# Altium footprint library Miscellaneous Socket.PcbLib: 51 footprints (part 3 of 4)
Each footprint in its own frame and in the unit in brackets; x right, y up, seen from the top. Pads: shape width x height; smd on the part's side, far side on the other; paste and mask are expansions set on the pad; w line width, h text height; cw(c..) or ccw(c..) is an arc to the next point about the centre after c.
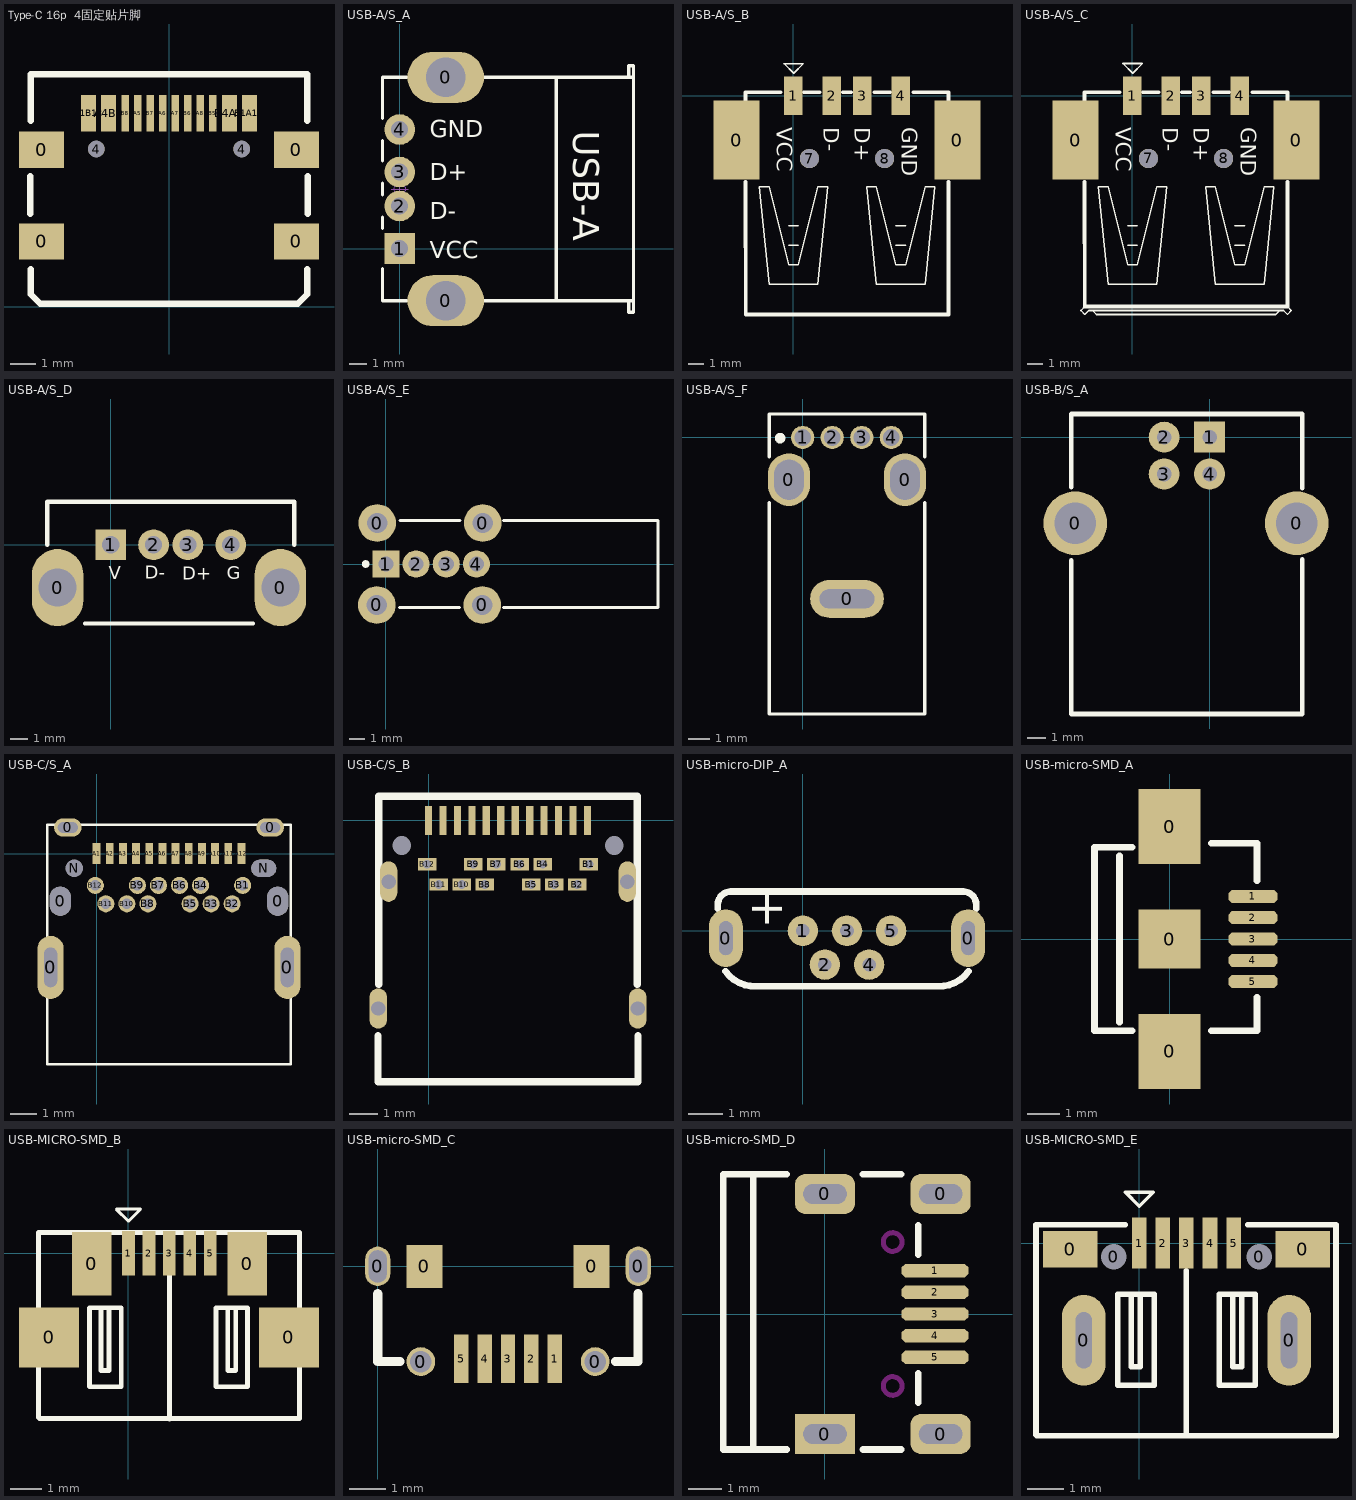
[diagram p2: the footprints below, top view; thin cyan lines are the x and y axes]

## Type-C 16p  4固定贴片脚 [mm] "USB Type-C 插座 4固定插脚"
pads (18):
  rect 1.8x1.45 smd: 0(-5.07,2.6) 0(-5.07,6.25) 0(5.07,2.6) 0(5.07,6.25)
  round 0.66 hole 0.66: 4(-2.89,6.28) 4(2.89,6.28)
  rect 0.6x1.45 smd: A1B12(-3.2,7.695) A4B9(-2.4,7.695) B1A12(3.2,7.695) B4A9(2.4,7.695)
  rect 0.3x1.45 smd: A5(-1.25,7.695) A6(-0.25,7.695) A7(0.25,7.695) A8(1.25,7.695) B5(1.75,7.695) B6(0.75,7.695) B7(-0.75,7.695) B8(-1.75,7.695)
Top Overlay:
  lines w0.254: -5.52,3.7 -5.52,5.2 ; -5.5,1.5 -5.5,0.5 -5.127,0.127 -5,0.127 5,0.127 5.127,0.127 5.5,0.5 5.5,1.5 ; -5.5,7.41 -5.5,9.25 5.5,9.25 5.5,7.41 ; 5.52,3.7 5.52,5.2

## USB-A/S_A [mm]
height 7.01
pads (6):
  oval 4.5x3 hole 2.3: 0(2.71,-3.07) 0(2.71,10.07)
  rect 1.8x1.8 hole 1: 1(0,0)
  round 1.8 hole 1: 2(0,2.5) 3(0,4.5) 4(0,7)
Top Overlay:
  lines w0.2: -1.01,-1.2 -1.01,-3.065 0.41,-3.065 ; -1.01,1.2 -1.01,1.84 ; -1.01,3.16 -1.01,3.84 ; -1.01,5.16 -1.01,6.34 ; -1.01,7.66 -1.01,10.065 0.41,10.065 ; 5.01,-3.065 13.752,-3.065 ; 5.01,10.065 13.752,10.065 ; 13.462,-3.065 13.462,-3.75 13.752,-3.75 13.752,10.75 13.462,10.75 13.462,10.065
  lines w0.203: 9.21,-3.065 9.21,10.065
  text "GND" at 1.778,6.548 h1.02
  text "D+" at 1.778,4.008 h1.02
  text "D-" at 1.778,1.722 h1.02
  text "VCC" at 1.778,-0.564 h1.02
  text "USB-A" at 10.21,6.93 h1.52
Mechanical 15:
  circle w0.05: c0,3.5 r0.35
  lines w0.05: -0.5,3.5 0.5,3.5 ; 0,3 0,4
3D body "USB-A_SA.STEP": height 6.8, standoff -4.31, extent -0.548,-3.81 13.756,10.874

## USB-A/S_B [mm]
pads (8):
  rect 3x5.15 smd: 0(-3.7,-2.9) 0(10.7,-2.9)
  rect 1.2x2.5 smd: 1(0,0) 2(2.5,0) 3(4.5,0) 4(7,0)
  round 1.25 hole 1.25 unplated: 7(1.05,-4.1) 8(5.95,-4.1)
Top Overlay:
  lines w0.1: -0.303,-9.749 0.332,-9.749 ; -0.303,-8.479 0.332,-8.479 ; 6.682,-9.749 7.317,-9.749 ; 6.682,-8.479 7.317,-8.479 ; -2.208,-5.939 -1.573,-12.289 1.602,-12.289 2.237,-5.939 1.602,-5.939 0.332,-11.019 -0.303,-11.019 -1.573,-5.939 -2.208,-5.939 ; -0.613,2.09 0.022,1.455 0.657,2.09 -0.613,2.09 ; 4.777,-5.939 5.412,-12.289 8.587,-12.289 9.222,-5.939 8.587,-5.939 7.317,-11.019 6.682,-11.019 5.412,-5.939 4.777,-5.939
  lines w0.254: -3.104,-5.624 -3.097,-14.26 10.111,-14.26 10.104,-5.624 ; -3.104,-0.29 -3.104,0.218 -0.818,0.218 ; 0.706,0.218 1.722,0.218 ; 3.246,0.218 3.754,0.218 ; 5.278,0.218 6.294,0.218 ; 7.818,0.218 10.111,0.218 10.104,-0.29
  text "GND" at 7.056,-2.068 h1.02
  text "D+" at 4.008,-2.068 h1.02
  text "D-" at 1.976,-2.068 h1.02
  text "VCC" at -1.072,-2.068 h1.02
3D body "USB-A_S-B.STEP": height 6.9, standoff -0.55, extent -4.321,-13.97 11.179,0.73

## USB-A/S_C [mm]
pads (8):
  rect 3x5.15 smd: 0(-3.7,-2.9) 0(10.7,-2.9)
  rect 1.2x2.5 smd: 1(0,0) 2(2.5,0) 3(4.5,0) 4(7,0)
  round 1.25 hole 1.25 unplated: 7(1.05,-4.1) 8(5.95,-4.1)
Top Overlay:
  lines w0.1: -3.097,-13.752 -3.351,-14.006 -3.097,-14.26 -2.843,-14.006 -2.589,-14.006 ; -0.303,-9.749 0.332,-9.749 ; -0.303,-8.479 0.332,-8.479 ; 6.682,-9.749 7.317,-9.749 ; 6.682,-8.479 7.317,-8.479 ; 10.111,-13.752 10.365,-14.006 10.111,-14.26 9.857,-14.006 9.603,-14.006 ; -2.589,-14.006 -2.335,-14.266 9.349,-14.266 9.603,-14.006 ; -2.589,-14.006 9.603,-14.006 ; -2.208,-5.939 -1.573,-12.289 1.602,-12.289 2.237,-5.939 1.602,-5.939 0.332,-11.019 -0.303,-11.019 -1.573,-5.939 -2.208,-5.939 ; -0.613,2.09 0.022,1.455 0.657,2.09 -0.613,2.09 ; 4.777,-5.939 5.412,-12.289 8.587,-12.289 9.222,-5.939 8.587,-5.939 7.317,-11.019 6.682,-11.019 5.412,-5.939 4.777,-5.939
  lines w0.254: -3.104,-5.624 -3.097,-13.752 10.111,-13.752 10.104,-5.624 ; -3.104,-0.29 -3.104,0.218 -0.818,0.218 ; 0.706,0.218 1.722,0.218 ; 3.246,0.218 3.754,0.218 ; 5.278,0.218 6.294,0.218 ; 7.818,0.218 10.111,0.218 10.104,-0.29
  text "GND" at 7.056,-2.068 h1.02
  text "D+" at 4.008,-2.068 h1.02
  text "D-" at 1.976,-2.068 h1.02
  text "VCC" at -1.072,-2.068 h1.02
3D body "USB-A_S-C.STEP": height 7.4, standoff -0.55, extent -4.321,-14.192 11.179,0.508

## USB-A/S_D [mm]
pads (6):
  oval 3x4.5 hole 2.2: 0(-3.1,-2.5) 0(9.9,-2.5)
  rect 1.8x1.8 hole 1: 1(0,0)
  round 1.8 hole 1: 2(2.5,0) 3(4.5,0) 4(7,0)
Top Overlay:
  lines w0.254: -3.7,0 -3.7,2.5 10.7,2.5 10.7,0 ; -1.5,-4.6 8.3,-4.6
  text "D-" at 1.996,-1.981 h0.76
  text "D+" at 4.181,-2.032 h0.76
  text "G" at 6.771,-2.007 h0.76
  text "V" at -0.112,-2.007 h0.76
Mechanical 1:
  lines w0.254: -0.2,-0.2 cw(c0,-0.2) 0,0
3D body "USB-A_S-D.STEP": height 14, standoff -4, extent -3.644,-4.587 10.756,2.413

## USB-A/S_E [mm]
pads (8):
  round 2.5 hole 1.35: 0(-0.607,-2.718) 0(-0.581,2.718) 0(6.393,-2.718) 0(6.419,2.718)
  rect 1.8x1.8 hole 1: 1(0,0)
  round 1.8 hole 1: 2(2,0) 3(4,0) 4(6,0)
Top Overlay:
  circle w0.25: c-1.35,0 r0.125
  lines w0.2: 0.91,-2.878 4.876,-2.878 ; 0.936,2.878 4.902,2.878 ; 7.787,-2.88 18.052,-2.88 18.052,2.88 7.787,2.88

## USB-A/S_F [mm]
pads (7):
  oval 2x2.5 hole 1.4 slot 1.9 at 90 deg: 0(-0.65,-2) 0(4.85,-2)
  oval 3.5x1.8 hole 0.9 slot 2.6 at 0 deg: 0(2.1,-7.65)
  round 1.1 hole 0.8: 1(0,0) 2(1.4,0) 3(2.8,0) 4(4.2,0)
Top Overlay:
  circle w0.25: c-1.073,-0.03 r0.125
  lines w0.152: -1.583,-3.078 -1.583,-13.111 5.783,-13.111 5.783,-3.078 ; -1.583,-0.919 -1.583,1.113 5.783,1.113 5.783,-0.919
3D body "USB-A_S-F.STEP": height 13.7, standoff -3.05, extent -1.532,-13.096 5.588,0.904

## USB-B/S_A [mm]
height 1.1
pads (6):
  round 3.5 hole 2.3: 0(-7.391,-4.742) 0(4.801,-4.742)
  rect 1.7x1.7 hole 0.8: 1(0,0)
  round 1.7 hole 0.8: 2(-2.5,0) 3(-2.5,-2.032) 4(0,-2.032)
Top Overlay:
  lines w0.254: -7.6,-6.769 -7.6,-15.24 5.1,-15.24 5.1,-6.718 ; -7.6,-2.756 -7.6,1.27 5.1,1.27 5.1,-2.807
3D body "USB-B_S-A.STEP": height 11.45, standoff -2.95, extent -8.004,-15.262 5.715,1.038

## USB-C/S_A [mm]
pads (32):
  oval 1x2.4 hole 0.5 slot 1.5 at 90 deg: 0(-1.75,-4.325) 0(7.25,-4.325)
  oval 0.8x1.1 hole 0.8 slot 1.1 at 90 deg: 0(-1.38,-1.81) 0(6.88,-1.81)
  oval 1.05x0.7 hole 0.4 slot 0.75 at 0 deg: 0(-1.095,0.99) 0(6.595,0.99)
  rect 0.3x0.8 smd: A1(0,0) A2(0.5,0) A3(1,0) A4(1.5,0) A5(2,0) A6(2.5,0) A7(3,0) A8(3.5,0) A9(4,0) A10(4.5,0) A11(5,0) A12(5.5,0)
  round 0.65 hole 0.4: B1(5.55,-1.21) B2(5.15,-1.91) B3(4.35,-1.91) B4(3.95,-1.21) B5(3.55,-1.91) B6(3.15,-1.21) B7(2.35,-1.21) B8(1.95,-1.91) B9(1.55,-1.21) B10(1.15,-1.91) B11(0.35,-1.91) B12(-0.05,-1.21)
  round 0.65 hole 0.65: N(-0.85,-0.56)
  oval 0.95x0.65 hole 0.65 slot 0.95 at 0 deg: N(6.35,-0.56)
Top Overlay:
  lines w0.1: -1.875,-8.01 -1.875,1.09 7.375,1.09 7.375,-8.01 -1.875,-8.01

## USB-C/S_B [mm]
pads (30):
  rect 0.25x1 smd: A1(0,0) A2(0.5,0) A3(1,0) A4(1.5,0) A5(2,0) A6(2.5,0) A7(3,0) A8(3.5,0) A9(4,0) A10(4.5,0) A11(5,0) A12(5.5,0)
  rect 0.64x0.42 hole 0.3: B1(5.55,-1.517) B2(5.15,-2.217) B3(4.35,-2.217) B4(3.95,-1.517) B5(3.55,-2.217) B6(3.15,-1.517) B7(2.35,-1.517) B8(1.95,-2.217) B9(1.55,-1.517) B10(1.15,-2.217) B11(0.35,-2.217) B12(-0.05,-1.517)
  oval 0.6x1.4 hole 0.5: ""(-1.74,-6.507) ""(-1.38,-2.117) ""(6.88,-2.117) ""(7.24,-6.507)
  round 0 hole 0.65: ""(-0.925,-0.867) ""(6.425,-0.867)
Top Overlay:
  lines w0.254: -1.75,-7.453 -1.75,-9.037 7.25,-9.037 7.25,-7.453 ; -1.725,-5.667 -1.725,0.833 7.225,0.833 7.225,-5.667

## USB-micro-DIP_A [mm]
pads (7):
  oval 1x1.7 hole 0.4 slot 1 at 90 deg: 0(-2.275,-0.22) 0(4.875,-0.22)
  round 0.9 hole 0.4: 1(0,0) 2(0.65,-1) 3(1.3,0) 4(1.95,-1) 5(2.6,0)
Top Overlay:
  lines w0.2: -2.51,0.643 -2.51,0.77 cw(c-2.129,0.77) -2.129,1.151 -1.875,1.151 -1.494,1.151 4.094,1.151 4.475,1.151 4.729,1.151 cw(c4.729,0.77) 5.11,0.77 5.11,0.643 ; -2.287,-1.197 ccw(c-1.418,-0.576) -1.367,-1.643 ; -1.329,-1.643 -1.113,-1.643 3.713,-1.643 3.967,-1.643 ccw(c4.018,-0.576) 4.887,-1.197
  text "+" at -0.605,0.059 h1.02
3D body "USB-MICRO_C.STEP": height 5.65, standoff -1.55, extent -2.668,-1.741 5.334,1.233

## USB-micro-SMD_A [mm]
pads (8):
  rect 1.9x2.286 smd: 0(0,-3.429) 0(0,3.429)
  rect 1.9x1.8 smd: 0(0,0)
  oct 1.5x0.4 smd: 1(2.54,1.3) 2(2.54,0.65) 3(2.54,0) 4(2.54,-0.65) 5(2.54,-1.3)
Top Overlay:
  lines w0.2: -1.524,-2.54 -1.524,2.54 ; -1.143,-2.794 -2.286,-2.794 -2.286,2.794 -1.143,2.794 ; 1.27,-2.794 2.667,-2.794 2.667,-1.778 ; 1.27,2.921 2.667,2.921 2.667,1.778
3D body "USB-MICRO_A.STEP": height 2.69, standoff -0.24, extent -2.552,-3.988 2.87,3.976

## USB-MICRO-SMD_B [mm]
pads (9):
  rect 1.9x1.9 smd: 0(-2.515,-2.667) 0(5.08,-2.667)
  rect 1.25x2 smd: 0(-1.168,-0.33) 0(3.759,-0.33)
  rect 0.4x1.4 smd: 1(0,0) 2(0.648,0) 3(1.295,0) 4(1.943,0) 5(2.591,0)
Top Overlay:
  lines w0.1: -0.381,1.397 0,1.016 0.381,1.397 -0.381,1.397
  lines w0.152: -2.845,-5.207 -2.845,0.66 ; -2.819,-5.232 5.385,-5.232 ; -2.794,0.66 5.385,0.66 ; -0.869,-1.728 -0.869,-3.713 -0.666,-3.713 -0.615,-3.713 -0.615,-1.728 ; 1.296,-5.244 1.296,0.635 ; 3.144,-1.728 3.144,-3.713 3.398,-3.713 3.398,-1.728 ; 5.41,-5.232 5.41,0.66 ; -1.23,-4.227 -1.23,-1.728 -0.23,-1.728 -0.23,-4.227 -1.23,-4.227 ; 2.77,-4.227 3.77,-4.227 3.77,-1.728 2.77,-1.728 2.77,-4.227
3D body "USB-MICRO_A.STEP": height 2.69, standoff -0.24, extent -2.712,-5.08 5.252,0.342

## USB-micro-SMD_C [mm]
pads (11):
  oval 0.7x1.1 hole 0.5 slot 0.9 at 90 deg: 0(0,0) 0(7.25,0)
  round 0.8 hole 0.6: 0(1.2,-2.65) 0(6.05,-2.65)
  rect 1x1.2 smd: 0(1.3,0) 0(5.95,0)
  rect 0.4x1.35 smd: 1(4.925,-2.575) 2(4.275,-2.575) 3(3.625,-2.575) 4(2.975,-2.575) 5(2.325,-2.575)
Top Overlay:
  lines w0.254: 0,-0.762 0,-2.65 0.618,-2.65 ; 6.621,-2.65 7.239,-2.65 7.239,-0.762
3D body "USB-MICRO_B.STEP": height 2.8, standoff -0.95, extent -0.369,-2.87 7.633,2.73

## USB-micro-SMD_D [mm]
pads (9):
  rect 1.8x1.2 hole 0.6 slot 1.3 at 0 deg: 0(0,-3.6)
  rrect50% 1.8x1.2 hole 0.6 slot 1.3 at 0 deg: 0(0,3.6) 0(3.47,-3.6) 0(3.47,3.6)
  oct 2x0.4 smd: 1(3.302,1.3) 2(3.302,0.65) 3(3.302,0) 4(3.302,-0.65) 5(3.302,-1.3)
Top Overlay:
  lines w0.2: -1.143,-4.064 -2.15,-4.064 ; -1.143,4.191 -2.15,4.191 ; 1.143,-4.064 2.286,-4.064 ; 1.143,4.191 2.286,4.191 ; 2.794,-2.667 2.794,-1.778 ; 2.794,1.778 2.794,2.667 ; -2.15,-4.064 -2.15,4.191 ; -2.15,-4.064 -3.048,-4.064 -3.048,-2.794 -3.048,2.794 -3.048,4.191 -2.15,4.191
Keep-Out Layer:
  circle w0.15: c2.032,2.159 r0.28
  circle w0.15: c2.032,-2.159 r0.28

## USB-MICRO-SMD_E [mm]
pads (11):
  rect 1.5x1 smd: 0(-1.905,-0.167) 0(4.495,-0.167)
  oval 1.2x2.5 hole 0.45 slot 1.55 at 90 deg: 0(-1.53,-2.673) 0(4.12,-2.673)
  round 0.6 hole 0.7 unplated: 0(-0.705,-0.373) 0(3.295,-0.373)
  rect 0.4x1.4 smd: 1(0,0) 2(0.648,0) 3(1.295,0) 4(1.943,0) 5(2.591,0)
Top Overlay:
  lines w0.1: -0.381,1.397 0,1.016 0.381,1.397 -0.381,1.397
  lines w0.15: -2.845,0.508 -0.394,0.508 ; 1.295,-5.296 1.295,-0.762 ; 2.984,0.508 5.41,0.508
  lines w0.152: -2.845,-5.271 -2.845,0.508 ; -2.82,-5.296 5.385,-5.296 ; -0.229,-1.41 -0.229,-3.395 -0.025,-3.395 0.025,-3.395 0.025,-1.41 ; 2.565,-1.41 2.565,-3.395 2.819,-3.395 2.819,-1.41 ; 5.41,-5.296 5.41,0.508 ; -0.589,-3.91 0.411,-3.91 0.411,-1.41 -0.589,-1.41 -0.589,-3.91 ; 2.191,-3.91 2.191,-1.41 3.191,-1.41 3.191,-3.91 2.191,-3.91
3D body "USB-MICRO_D.STEP": height 2.8, standoff -1.35, extent -2.731,-5.346 5.271,0.254